# Altium footprint library Rez-Axial Pot.PcbLib: 113 footprints (part 3 of 8)
Each footprint in its own frame and in the unit in brackets; x right, y up, seen from the top. Pads: shape width x height; smd on the part's side, far side on the other; paste and mask are expansions set on the pad; w line width, h text height; cw(c..) or ccw(c..) is an arc to the next point about the centre after c.
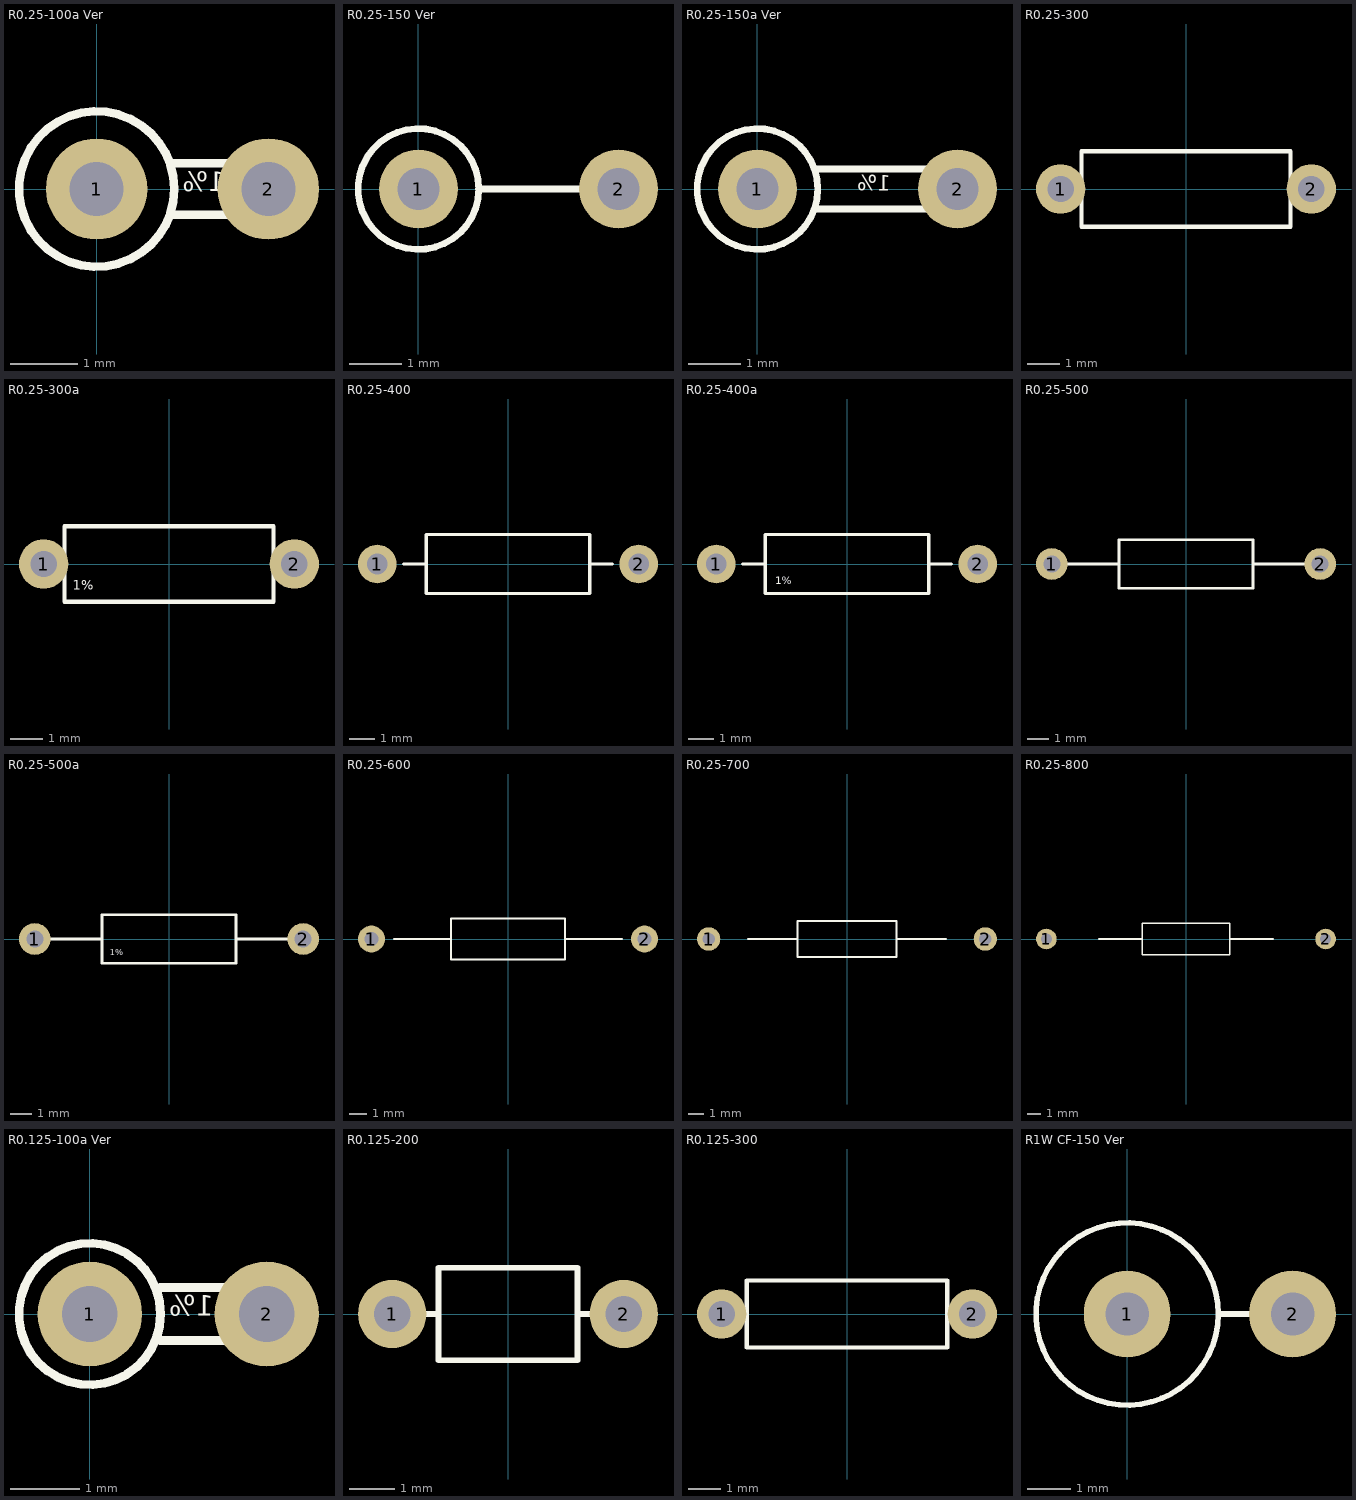
[diagram p2: the footprints below, top view; thin cyan lines are the x and y axes]

## R0.25-100a Ver [mm]
pads (2):
  round 1.5 hole 0.8: 1(0,0) 2(2.54,0)
TopOverlay:
  circle w0.127: c0,0 r1.15
  lines w0.127: 1.143,-0.381 2.54,-0.381 ; 1.143,0.381 2.54,0.381
  text "1%" at 1.905,-0.127 h0.5
3D body "Res (0.25W)-100a Ver.STEP": height 8.07, standoff -2.54, extent -1.15,-1.15 2.84,1.15

## R0.25-150 Ver [mm]
pads (2):
  round 1.5 hole 0.8: 1(0,0) 2(3.81,0)
TopOverlay:
  circle w0.127: c0,0 r1.15
  lines w0.127: 1.143,0 3.81,0
3D body "Res (0.25W)-150 Ver.STEP": height 8.7, standoff -2.54, extent -1.15,-1.15 4.11,1.15

## R0.25-150a Ver [mm]
pads (2):
  round 1.5 hole 0.8: 1(0,0) 2(3.81,0)
TopOverlay:
  circle w0.127: c0,0 r1.15
  lines w0.127: 1.143,-0.381 3.81,-0.381 ; 1.143,0.381 3.81,0.381
  text "1%" at 2.54,-0.127 h0.5
3D body "Res (0.25W)-150a Ver.STEP": height 8.7, standoff -2.54, extent -1.15,-1.15 4.11,1.15

## R0.25-300 [mm]
pads (2):
  round 1.5 hole 0.8: 1(-3.81,0) 2(3.81,0)
TopOverlay:
  lines w0.127: -3.556,0 -3.175,0 ; 3.2,0 3.556,0 ; -3.175,-1.15 -3.175,1.15 3.175,1.15 3.175,-1.15 -3.175,-1.15
3D body "Res-(0.25W)-300.STEP": height 2.3, standoff -2.54, extent -4.11,-1.15 4.11,1.15

## R0.25-300a [mm]
pads (2):
  round 1.5 hole 0.8: 1(-3.81,0) 2(3.81,0)
TopOverlay:
  lines w0.127: -3.556,0 -3.175,0 ; 3.2,0 3.556,0 ; -3.175,-1.15 3.175,-1.15 3.175,1.15 -3.175,1.15 -3.175,-1.15
  text "1%" at -2.921,-0.889 h0.5
3D body "Res-(0.25W)-300a.STEP": height 2.3, standoff -2.54, extent -4.11,-1.15 4.11,1.15

## R0.25-400 [mm]
pads (2):
  round 1.5 hole 0.8: 1(-5.08,0) 2(5.08,0)
TopOverlay:
  lines w0.127: -4.064,0 -3.175,0 ; 3.2,0 4.064,0 ; -3.175,-1.15 3.175,-1.15 3.175,1.15 -3.175,1.15 -3.175,-1.15
3D body "Res-(0.25W)-400.STEP": height 2.3, standoff -2.54, extent -5.38,-1.15 5.38,1.15

## R0.25-400a [mm]
pads (2):
  round 1.5 hole 0.8: 1(-5.08,0) 2(5.08,0)
TopOverlay:
  lines w0.127: -4.064,0 -3.175,0 ; 3.2,0 4.064,0 ; -3.175,-1.15 -3.175,1.15 3.175,1.15 3.175,-1.15 -3.175,-1.15
  text "1%" at -2.794,-0.889 h0.5
3D body "Res-(0.25W)-400a.STEP": height 2.3, standoff -2.54, extent -5.38,-1.15 5.38,1.15

## R0.25-500 [mm]
pads (2):
  round 1.5 hole 0.8: 1(-6.35,0) 2(6.35,0)
TopOverlay:
  lines w0.127: -6.35,0 -3.175,0 ; 3.2,0 6.35,0 ; -3.175,-1.15 -3.175,1.15 3.175,1.15 3.175,-1.15 -3.175,-1.15
3D body "Res-(0.25W)-500.step": height 2.3, standoff -2.54, extent -6.65,-1.15 6.65,1.15

## R0.25-500a [mm]
pads (2):
  round 1.5 hole 0.8: 1(-6.35,0) 2(6.35,0)
TopOverlay:
  lines w0.127: -6.35,0 -3.175,0 ; 3.2,0 6.35,0 ; -3.175,-1.15 3.175,-1.15 3.175,1.15 -3.175,1.15 -3.175,-1.15
  text "1%" at -2.794,-0.889 h0.5
3D body "Res-(0.25W)-500a.STEP": height 2.3, standoff -2.54, extent -6.65,-1.15 6.65,1.15

## R0.25-600 [mm]
pads (2):
  round 1.5 hole 0.8: 1(-7.62,0) 2(7.62,0)
TopOverlay:
  lines w0.127: -6.35,0 -3.175,0 ; 3.2,0 6.35,0 ; -3.175,-1.15 3.175,-1.15 3.175,1.15 -3.175,1.15 -3.175,-1.15
3D body "Res-(0.25W)-600.STEP": height 2.3, standoff -2.54, extent -7.92,-1.15 7.92,1.15

## R0.25-700 [mm]
pads (2):
  round 1.5 hole 0.8: 1(-8.89,0) 2(8.89,0)
TopOverlay:
  lines w0.127: -6.35,0 -3.175,0 ; 3.2,0 6.35,0 ; -3.175,-1.15 -3.175,1.15 3.175,1.15 3.175,-1.15 -3.175,-1.15
3D body "Res-(0.25W)-700.STEP": height 2.3, standoff -2.54, extent -9.19,-1.15 9.19,1.15

## R0.25-800 [mm]
pads (2):
  round 1.5 hole 0.8: 1(-10.16,0) 2(10.16,0)
TopOverlay:
  lines w0.127: -6.35,0 -3.175,0 ; 3.2,0 6.35,0 ; -3.175,-1.15 -3.175,1.15 3.175,1.15 3.175,-1.15 -3.175,-1.15
3D body "Res-(0.25W)-800.STEP": height 2.3, standoff -2.54, extent -10.46,-1.15 10.46,1.15

## R0.125-100a Ver [mm]
pads (2):
  round 1.5 hole 0.8: 1(0,0) 2(2.54,0)
TopOverlay:
  circle w0.127: c0,0 r1.016
  lines w0.127: 1.016,-0.381 2.54,-0.381 ccw(c2.54,0) 2.54,0.381 1.016,0.381
  text "1%" at 1.778,-0.127 h0.5
3D body "Res (0.25W)-100 Ver.STEP": height 8.07, standoff -2.54, extent -1.15,-1.15 2.84,1.15

## R0.125-200 [mm]
pads (2):
  round 1.5 hole 0.8: 1(-2.54,0) 2(2.54,0)
TopOverlay:
  lines w0.127: -1.778,0 -1.524,0 ; 1.549,0 1.778,0 ; -1.524,-1.016 1.524,-1.016 1.524,1.016 -1.524,1.016 -1.524,-1.016
3D body "Res (0.125W)-200.STEP": height 2.93, standoff -2.54, extent -2.845,-1.153 2.845,1.153

## R0.125-300 [mm]
pads (2):
  round 1.5 hole 0.8: 1(-3.81,0) 2(3.81,0)
TopOverlay:
  lines w0.127: -3.302,0 -3.048,0 ; 3.073,0 3.302,0 ; -3.048,-1.016 -3.048,1.016 3.048,1.016 3.048,-1.016 -3.048,-1.016
3D body "Res (0.125W)-300.STEP": height 2.93, standoff -2.54, extent -4.115,-1.153 4.115,1.153

## R1W CF-150 Ver [mm]
pads (2):
  round 2 hole 1: 1(0,0) 2(3.81,0)
TopOverlay:
  circle w0.127: c0,0 r2.1
  lines w0.127: 2.159,0 3.175,0
3D body "Res-(1W)CF-150 Ver.STEP": height 14.71, standoff -2.03, extent -2.1,-2.1 4.11,2.1